# Altium footprint library Hydrolib_pcb.PcbLib: 101 footprints (part 3 of 7)
Each footprint in its own frame and in the unit in brackets; x right, y up, seen from the top. Pads: shape width x height; smd on the part's side, far side on the other; paste and mask are expansions set on the pad; w line width, h text height; cw(c..) or ccw(c..) is an arc to the next point about the centre after c.
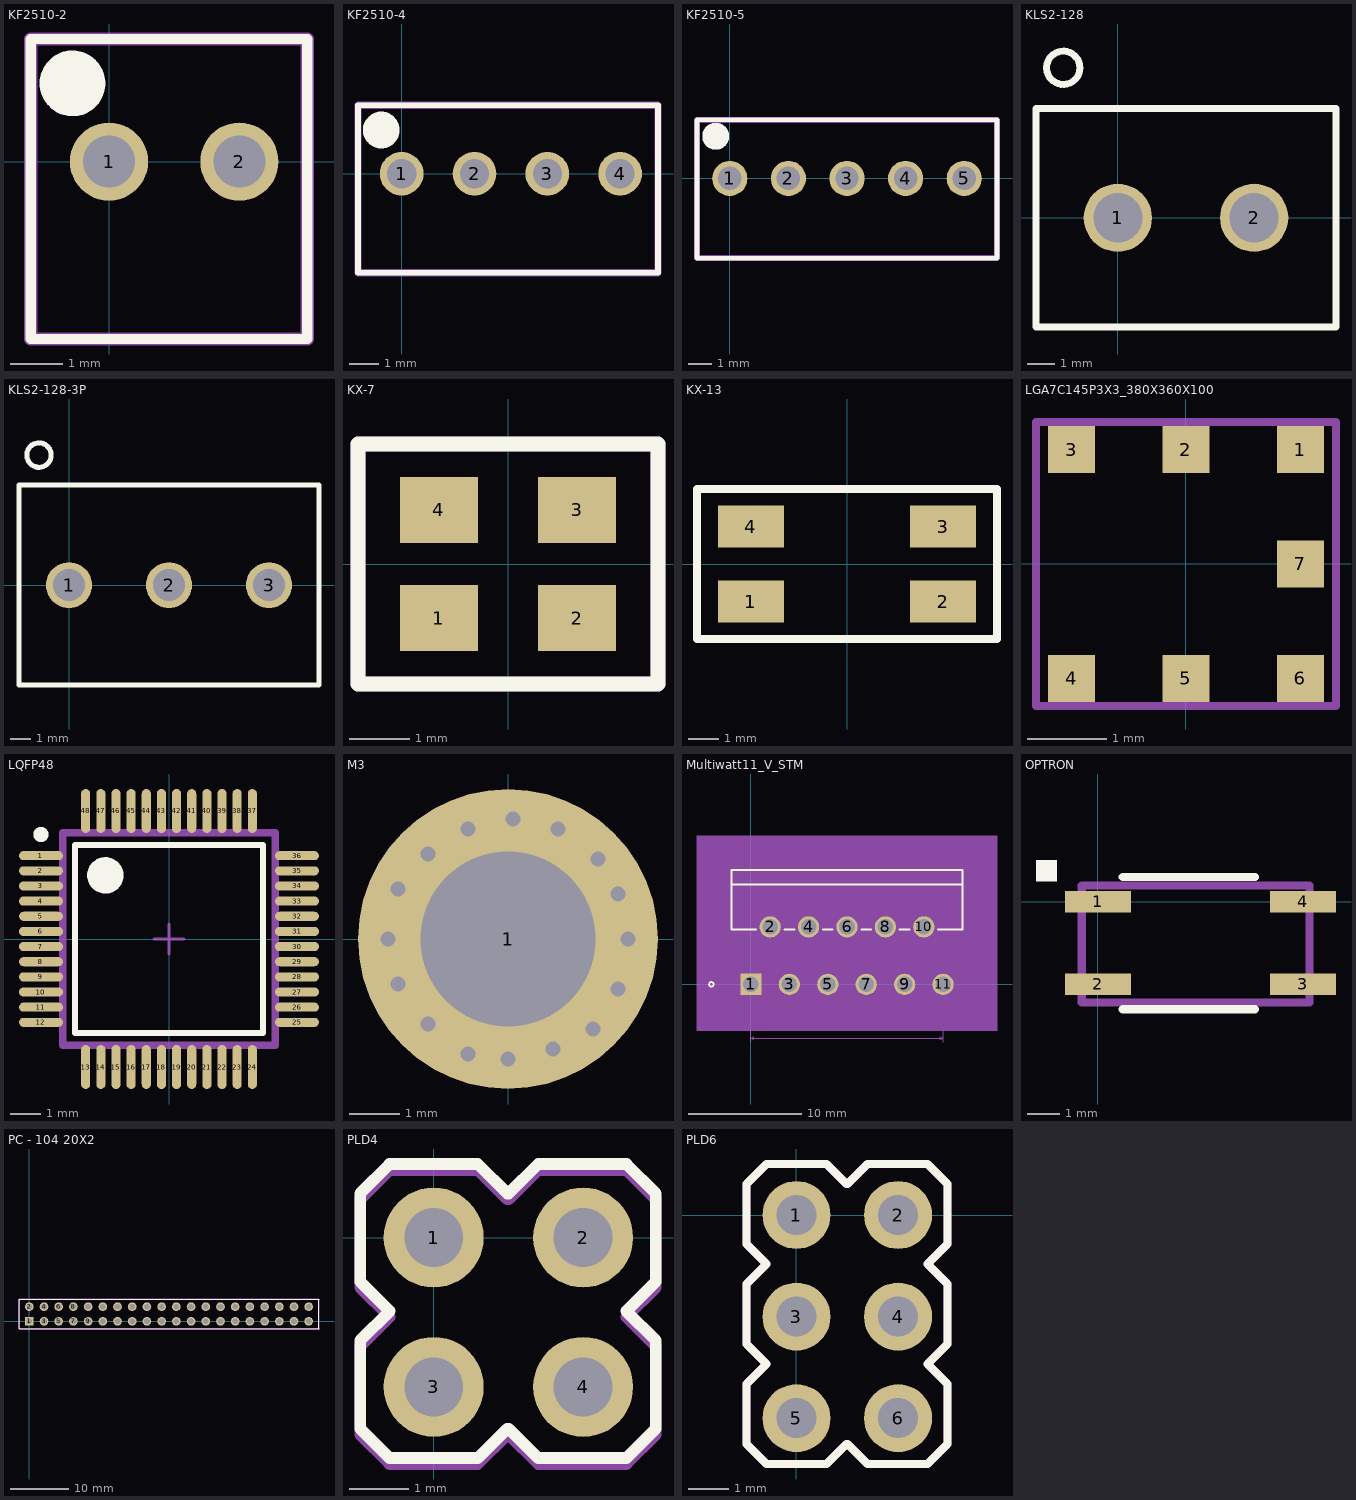
[diagram p2: the footprints below, top view; thin cyan lines are the x and y axes]

## KF2510-2 [mm]
pads (2):
  round 1.5 hole 1: 1(0,0) 2(2.5,0)
Top Overlay:
  circle w0.75: c-0.7,1.5 r0.255
  lines w0.2: -1.5,-3.4 3.8,-3.4 3.8,-1.15 3.8,2.35 -1.5,2.35 -1.5,-3.4
Pattern top:
  lines w0.25: -1.5,-3.4 -1.5,2.35 3.8,2.35 3.8,1.15 3.8,-3.4 -1.5,-3.4
  text ".Designator" at 0,-2.4 h2.15
3D body "WHITEHOUNSING2P.stp": height 11.22, standoff -3.5, extent -1.31,-3.5 3.77,2.5

## KF2510-4 [mm]
pads (4):
  round 1.5 hole 1: 1(0,0) 2(2.5,0) 3(5,0) 4(7.5,0)
Top Overlay:
  circle w0.75: c-0.7,1.5 r0.255
  lines w0.2: -1.5,-3.4 8.8,-3.4 8.8,-1.15 8.8,2.35 -1.5,2.35 -1.5,-3.4
Top Solder:
  lines w0.1: 8.75,-0.5 8.75,0.625
Pattern top:
  lines w0.25: -1.5,-3.4 -1.5,2.35 8.8,2.35 8.8,1.15 8.8,-3.4 -1.5,-3.4
  text ".Designator" at 0,-2.4 h2.15
3D body "WHITEHOUNSING4P.stp": height 11.22, standoff -3.5, extent -1.37,-3.5 8.79,2.5

## KF2510-5 [mm]
pads (5):
  round 1.5 hole 1: 1(0,0) 2(2.5,0) 3(5,0) 4(7.5,0) 5(10,0)
Top Overlay:
  circle w0.75: c-0.6,1.8 r0.2
  lines w0.2: -1.4,-3.4 -1.4,2.5 9.8,2.5 11.4,2.5 11.4,-3.4 -1.4,-3.4
Pattern top:
  lines w0.25: -1.4,-3.4 11.4,-3.4 11.4,2.5 9.8,2.5 -1.4,2.5 -1.4,-3.4
  text ".Designator" at 0.7,-2 h2.15
3D body "WHITEHOUNSING5P.stp": height 11.22, standoff -3.5, extent -1.35,-3.5 11.35,2.5

## KLS2-128 [mm] "перемычка для плат"
pads (2):
  round 2.5 hole 1.8: 1(0,0) 2(5,0)
Top Overlay:
  circle w0.254: c-2,5.5 r0.61
  lines w0.254: -3,-4 -3,4 8,4 8,-4 -3,-4
Pattern top:
  text ".Designator" at -2,1.15 h2.15
3D body: height 14.5, standoff 0, extent -3,-4 8,4

## KLS2-128-3P [mm]
pads (3):
  round 2.3 hole 1.6: 1(0,0) 2(5,0) 3(10,0)
Top Overlay:
  circle w0.254: c-1.5,6.5 r0.61
  lines w0.254: -2.5,-5 -2.5,5 12.5,5 12.5,-5 -2.5,-5
Pattern top:
  text ".Designator" at 0.813,1 h2.15
3D body: height 0.25, standoff 0, extent -2.5,-5 12.5,5

## KX-7 [mm]
pads (4):
  rect 1.3x1.1 smd: 1(-1.15,-0.9) 2(1.15,-0.9) 3(1.15,0.9) 4(-1.15,0.9)
Top Overlay:
  lines w0.254: -2.5,-2 -2.5,2 2.5,2 2.5,-2 -2.5,-2
Pattern top:
  lines w0.25: -2.5,-1.25 -2.5,-2 2.5,-2 2.5,2 -2.5,2 ; -2.5,-1.25 -2.5,2 ; -2.5,-1.25 -2.5,2
  text ".Designator" at -4.4,3.4 h2.15

## KX-13 [mm]
pads (4):
  rect 2.2x1.4 smd: 1(-3.2,-1.25) 2(3.2,-1.25) 3(3.2,1.25) 4(-3.2,1.25)
Top Overlay:
  lines w0.254: -5,-2.5 5,-2.5 5,2.5 -5,2.5 -5,-2.5
Pattern top:
  lines w0.25: -5,-2.5 -5,2.5 5,2.5 5,-2.5 -5,-2.5
  text ".Designator" at -4.4,3.4 h2.15
3D body "User Library-KX-13 7,37280.STEP": height 1.29, standoff -0.01, extent -3.5,-2.6 3.5,2.4

## L6203 [mm] "H bridge"
3D body "Transistor L298N.step": height 10, standoff -10, extent -4.5,-20.4 6.5,3.6

## LGA7C145P3X3_380X360X100 [mm] "LGA, 7-Leads, Body 3,80x3,60mmx1,00mm, Pitch 1,45mm"
height 1
pads (7):
  rect 0.6x0.6 smd: 1(1.45,1.45) 2(0,1.45) 3(-1.45,1.45) 4(-1.45,-1.45) 5(0,-1.45) 6(1.45,-1.45) 7(1.45,0)
Pattern top:
  lines w0.1: -1.9,-1.8 -1.9,1.8 1.9,1.8 1.9,-1.8 -1.9,-1.8
  text ".Designator" at -2.3,2.1 h1.5
3D body: height 1, standoff 0, extent -1.9,-1.8 1.9,1.8

## LQFP48 [mm] "LQFP48 - 48-pin, 7 x 7 mm low-profile quad flat package  mechanical data"
height 1.6
pads (48):
  oval 1.45x0.3 all layers, no hole: 1(-4.225,2.75) 2(-4.225,2.25) 3(-4.225,1.75) 4(-4.225,1.25) 5(-4.225,0.75) 6(-4.225,0.25) 7(-4.225,-0.25) 8(-4.225,-0.75) 9(-4.225,-1.25) 10(-4.225,-1.75) 11(-4.225,-2.25) 12(-4.225,-2.75) 25(4.225,-2.75) 26(4.225,-2.25) 27(4.225,-1.75) 28(4.225,-1.25) 29(4.225,-0.75) 30(4.225,-0.25) 31(4.225,0.25) 32(4.225,0.75) 33(4.225,1.25) 34(4.225,1.75) 35(4.225,2.25) 36(4.225,2.75)
  oval 0.3x1.45 all layers, no hole: 13(-2.75,-4.225) 14(-2.25,-4.225) 15(-1.75,-4.225) 16(-1.25,-4.225) 17(-0.75,-4.225) 18(-0.25,-4.225) 19(0.25,-4.225) 20(0.75,-4.225) 21(1.25,-4.225) 22(1.75,-4.225) 23(2.25,-4.225) 24(2.75,-4.225) 37(2.75,4.225) 38(2.25,4.225) 39(1.75,4.225) 40(1.25,4.225) 41(0.75,4.225) 42(0.25,4.225) 43(-0.25,4.225) 44(-0.75,4.225) 45(-1.25,4.225) 46(-1.75,4.225) 47(-2.25,4.225) 48(-2.75,4.225)
Top Overlay:
  circle w0.6: c-2.1,2.1 r0.3
  circle w0.25: c-4.225,3.45 r0.125
  lines w0.2: -3.1,-3.1 3.1,-3.1 3.1,3.1 -3.1,3.1 -3.1,-3.1
Pattern top:
  lines w0.25: -3.5,-3.5 3.5,-3.5 3.5,3.5 -3.5,3.5 -3.5,-3.5
  text ".Designator" at -1.9,-0.4 h2.15
Mechanical 15:
  lines w0.1: -0.5,0 0.5,0 ; 0,-0.5 0,0.5
3D body "LQFP48.step": height 1.6, standoff 0, extent -4.5,-4.5 4.5,4.5

## M3 [mm]
pads (1):
  round 6 hole 3.5: 1(0,0)
via 0.1,2.4 diameter 0.7 hole 0.3
via 2.4,0 diameter 0.7 hole 0.3
via 0,-2.4 diameter 0.7 hole 0.3
via -2.4,0 diameter 0.7 hole 0.3
via -2.2,1 diameter 0.7 hole 0.3
via -1.6,1.7 diameter 0.7 hole 0.3
via -0.8,2.2 diameter 0.7 hole 0.3
via 1,2.2 diameter 0.7 hole 0.3
via 1.8,1.6 diameter 0.7 hole 0.3
via 2.2,0.9 diameter 0.7 hole 0.3
via -2.2,-0.9 diameter 0.7 hole 0.3
via -1.6,-1.7 diameter 0.7 hole 0.3
via -0.8,-2.3 diameter 0.7 hole 0.3
via 0.9,-2.2 diameter 0.7 hole 0.3
via 1.7,-1.8 diameter 0.7 hole 0.3
via 2.2,-1 diameter 0.7 hole 0.3
Pattern top:
  text ".Designator" at -3.4,-4.2 h2.15
3D body "M3.STEP": height 2.5, standoff 0.1, extent -2.7,-3.175 2.8,3.175

## Multiwatt11_V_STM [mil]
pads (11):
  rect 74x74 hole 54 mask+0: 1(0,0)
  round 74 hole 54 mask+0: 2(66.93,200) 3(133.86,0) 4(200.79,200) 5(267.72,0) 6(334.65,200) 7(401.57,0) 8(468.5,200) 9(535.43,0) 10(602.36,200) 11(669.29,0)
Top Overlay:
  circle w6: c-137.85,0 r8
  lines w6: -62.85,348 732.15,348 ; 17.64,191 -67.85,191 -67.85,398 737.15,398 737.15,191 651.65,191 ; 116.21,191 151.5,191 ; 250.07,191 285.36,191 ; 383.93,191 419.22,191 ; 517.79,191 553.08,191
Pattern bot:
  region: -187.85,518 857.15,518 857.15,-162 -187.85,-162
Annotation bot:
  lines w1: -127.85,196 -62.85,196 ; -127.85,393 -62.85,393 -62.85,458 ; -50,-87 0,-87 ; 0,-202 0,0 0,-102 ; 66.93,-102 66.93,200 ; 116.93,-87 66.93,-87 ; 669.29,-202 669.29,0 797.15,0 ; 669.29,393 797.15,393 ; 732.15,393 732.15,458 ; -112.85,196 -107.85,206 -117.85,206 -112.85,196 ; -112.85,196 -112.85,393 ; -112.85,393 -107.85,383 -117.85,383 -112.85,393 ; -62.85,443 -52.85,438 -52.85,448 -62.85,443 ; -62.85,443 732.15,443 ; 0,-187 10,-192 10,-182 0,-187 ; 0,-187 669.29,-187 ; 0,-87 -10,-92 -10,-82 0,-87 ; 66.93,-87 76.93,-92 76.93,-82 66.93,-87 ; 669.29,-187 659.29,-192 659.29,-182 669.29,-187 ; 732.15,443 722.15,438 722.15,448 732.15,443 ; 782.15,0 787.15,10 777.15,10 782.15,0 ; 782.15,0 782.15,200 ; 782.15,200 787.15,190 777.15,190 782.15,200 ; 782.15,200 787.15,210 777.15,210 782.15,200 ; 782.15,200 782.15,393 ; 782.15,393 787.15,383 777.15,383 782.15,393 ; 602.36,200 797.15,200 602.36,200
  text "0.197in/5.004mm" at -320.35,282 h25
  text "0.795in/20.193mm" at 234.65,463 h25
  text "0.2in/5.08mm" at 802.15,87.5 h25
  text "0.193in/4.902mm" at 802.15,284 h25
  text "0.067in/1.7mm" at -47.79,-132 h25
  text "0.669in/17mm" at 259.65,-232 h25
  text "Alt 2 Padstyle: b229_152h76" at -2.85,-517 h50
  text "Alt 1 Padstyle: b152_229h76" at -2.85,-457 h50
  text "Pin 1 Padstyle: s188h137" at 34.65,-397 h50
  text "Default Padstyle: b188_188h137" at -40.35,-337 h50
Mechanical 13:
  circle w0: c-52.85,206 r8
  lines w1: -62.85,343 732.15,343 ; -62.85,196 -62.85,393 732.15,393 732.15,196 -62.85,196
  text "TAB" at 315.9,355.5 h25
Mechanical 15:
  region: 742.15,403 -72.85,403 -72.85,-47 742.15,-47
  lines w6: -72.85,-47 742.15,-47 742.15,403 -72.85,403 -72.85,-47
3D body: height 10, standoff 0, extent 0,0 10,10

## OPTRON [mil]
pads (4):
  rect 80x26 smd: 1(0,0) 2(0,-100) 3(248.03,-100) 4(248.03,0)
Top Overlay:
  region: -75,25 -50,25 -50,50 -75,50
  lines w10: 30,-130 190,-130 ; 30,30 190,30
Pattern top:
  lines w9.84: -19.68,-122.05 -19.68,19.68 255.91,19.68 255.91,-122.05 -19.68,-122.05
  text ".Designator" at -11.81,66.93 h84.65
3D body "User Library-HCPL-181-1.STEP": height 78.74, standoff -3.96, extent -19.68,-122.05 255.91,19.69

## PC - 104 20X2 [mm] "Connector; Header; 20x2 Position"
height 11.1
pads (40):
  rect 1.5x1.5 hole 1: 1(0,0)
  round 1.5 hole 1: 2(0,2.54) 3(2.54,0) 4(2.54,2.54) 5(5.08,0) 6(5.08,2.54) 7(7.62,0) 8(7.62,2.54) 9(10.16,0) 10(10.16,2.54) 11(12.7,0) 12(12.7,2.54) 13(15.24,0) 14(15.24,2.54) 15(17.78,0) 16(17.78,2.54) 17(20.32,0) 18(20.32,2.54) 19(22.86,0) 20(22.86,2.54) 21(25.4,0) 22(25.4,2.54) 23(27.94,0) 24(27.94,2.54) 25(30.48,0) 26(30.48,2.54) 27(33.02,0) 28(33.02,2.54) 29(35.56,0) 30(35.56,2.54) 31(38.1,0) 32(38.1,2.54) 33(40.64,0) 34(40.64,2.54) 35(43.18,0) 36(43.18,2.54) 37(45.72,0) 38(45.72,2.54) 39(48.26,0) 40(48.26,2.54)
Top Overlay:
  lines w0.2: -1.78,-1.27 50.04,-1.27 ; -1.78,3.81 50.04,3.81 ; -1.778,-1.27 -1.778,3.81 ; 50.038,-1.27 50.038,3.81
Bottom Overlay:
  lines w0.2: -1.78,-1.27 50.04,-1.27 ; -1.78,3.81 50.04,3.81 ; -1.778,-1.27 -1.778,3.81 ; 50.038,-1.27 50.038,3.81
Pattern top:
  lines w0.25: -1.78,-1.27 50.038,-1.27 50.038,3.81 -1.78,3.81 -1.78,-1.27
  text ".Designator" at 18.2,5.8 h2.15
3D body "pc104-40 тип 2.STEP": height 11.05, standoff -12.2, extent -1.52,-1.205 49.78,3.745

## PLD4 [mm]
pads (4):
  round 1.7 hole 1 paste+0: 1(0,0) 2(2.54,0) 3(0,-2.54) 4(2.54,-2.54)
Top Overlay:
  lines w0.2: 1.25,-3.25 0.75,-3.75 -0.75,-3.75 -1.25,-3.25 -1.25,-1.75 -0.75,-1.25 -1.25,-0.75 -1.25,0.75 -0.75,1.25 0.75,1.25 1.25,0.75 ; 1.275,-3.25 1.775,-3.75 3.275,-3.75 3.775,-3.25 3.775,-1.75 3.275,-1.25 3.775,-0.75 3.775,0.75 3.275,1.25 1.775,1.25 1.275,0.75
Pattern top:
  lines w0.2: 1.25,-3.35 0.75,-3.85 -0.75,-3.85 -1.25,-3.35 -1.25,-1.85 -0.75,-1.35 -1.25,-0.85 -1.25,0.65 -0.75,1.15 0.75,1.15 1.25,0.65 ; 1.275,-3.35 1.775,-3.85 3.275,-3.85 3.775,-3.35 3.775,-1.85 3.275,-1.35 3.775,-0.85 3.775,0.65 3.275,1.15 1.775,1.15 1.275,0.65
  text ".Designator" at -2.9,1.8 h2.15
3D body "User Library-PLS-1.STEP": height 8.44, standoff -3, extent -1.27,-1.27 1.27,1.27
3D body "User Library-PLS-1.STEP": height 8.44, standoff -3, extent 1.27,-1.27 3.81,1.27
3D body "User Library-PLS-1.STEP": height 8.44, standoff -3, extent -1.27,-3.81 1.27,-1.27
3D body "User Library-PLS-1.STEP": height 8.44, standoff -3, extent 1.27,-3.81 3.81,-1.27

## PLD6 [mm]
pads (6):
  round 1.7 hole 1 paste+0: 1(0,0) 2(2.54,0) 3(0,-2.54) 4(2.54,-2.54) 5(0,-5.08) 6(2.54,-5.08)
Top Overlay:
  lines w0.2: 1.25,-5.725 0.75,-6.225 -0.75,-6.225 -1.25,-5.725 -1.25,-4.225 -0.75,-3.725 -1.25,-3.225 -1.25,-1.725 -0.75,-1.225 -1.25,-0.725 -1.25,0.775 -0.75,1.275 0.75,1.275 1.25,0.775 ; 1.275,-5.725 1.775,-6.225 3.275,-6.225 3.775,-5.725 3.775,-4.225 3.275,-3.725 3.775,-3.225 3.775,-1.725 3.275,-1.225 3.775,-0.725 3.775,0.775 3.275,1.275 1.775,1.275 1.275,0.775
Pattern top:
  lines w0.2: 1.25,-5.725 0.75,-6.225 -0.75,-6.225 -1.25,-5.725 -1.25,-4.225 -0.75,-3.725 -1.25,-3.225 -1.25,-1.725 -0.75,-1.225 -1.25,-0.725 -1.25,0.775 -0.75,1.275 0.75,1.275 1.25,0.775 ; 1.275,-5.725 1.775,-6.225 3.275,-6.225 3.775,-5.725 3.775,-4.225 3.275,-3.725 3.775,-3.225 3.775,-1.725 3.275,-1.225 3.775,-0.725 3.775,0.775 3.275,1.275 1.775,1.275 1.275,0.775
  text ".Designator" at -3.1,2 h2.15
3D body "User Library-PLS-1.STEP": height 8.44, standoff -3, extent -1.27,-1.27 1.27,1.27
3D body "User Library-PLS-1.STEP": height 8.44, standoff -3, extent 1.27,-1.27 3.81,1.27
3D body "User Library-PLS-1.STEP": height 8.44, standoff -3, extent -1.27,-3.81 1.27,-1.27
3D body "User Library-PLS-1.STEP": height 8.44, standoff -3, extent 1.27,-3.81 3.81,-1.27
3D body "User Library-PLS-1.STEP": height 8.44, standoff -3, extent 1.27,-6.35 3.81,-3.81
3D body "User Library-PLS-1.STEP": height 8.44, standoff -3, extent -1.27,-6.35 1.27,-3.81